# Altium footprint library NXP_60_26022015.PCBLIB: 287 footprints (part 11 of 18)
Each footprint in its own frame and in the unit in brackets; x right, y up, seen from the top. Pads: shape width x height; smd on the part's side, far side on the other; paste and mask are expansions set on the pad; w line width, h text height; cw(c..) or ccw(c..) is an arc to the next point about the centre after c.
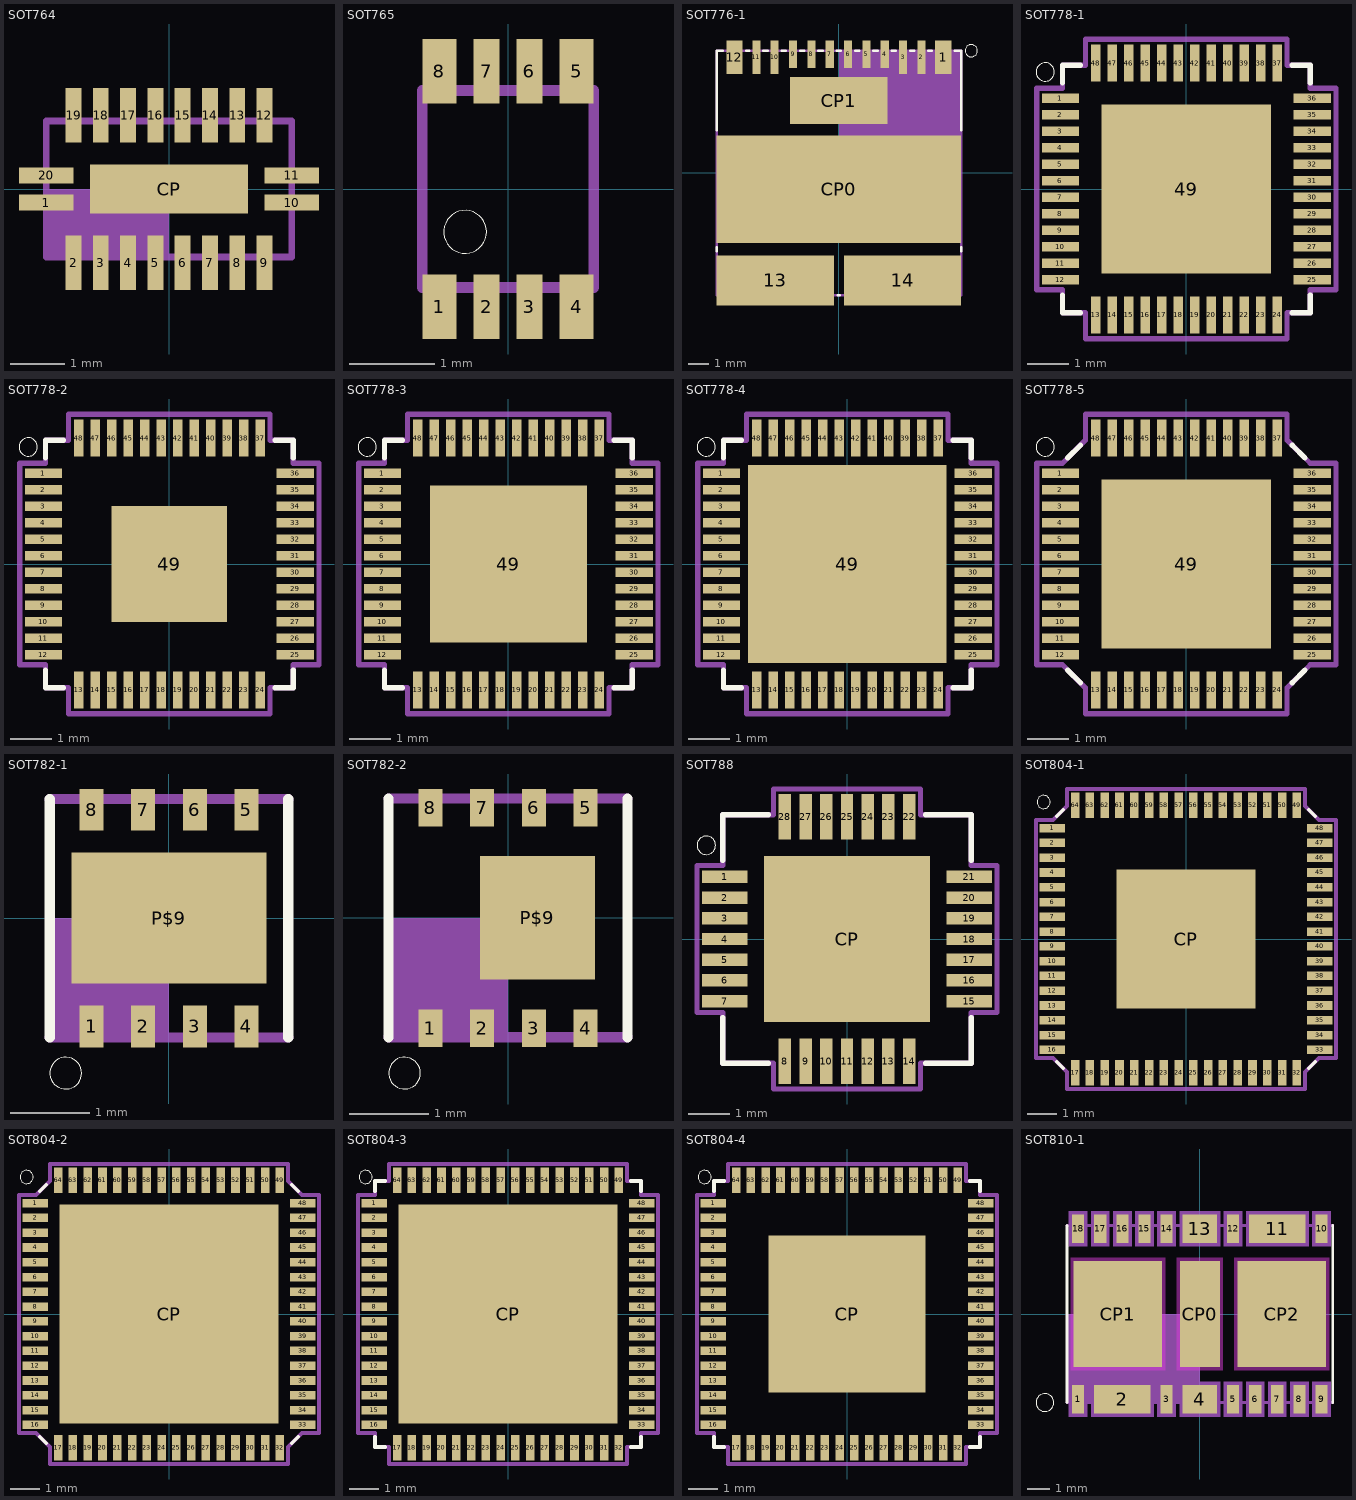
[diagram p10: the footprints below, top view; thin cyan lines are the x and y axes]

## SOT764 [mm]
pads (21):
  rect 1x0.29 smd: 1(-2.25,-0.25) 10(2.25,-0.25) 11(2.25,0.25) 20(-2.25,0.25)
  rect 0.29x1 smd: 2(-1.75,-1.35) 3(-1.25,-1.35) 4(-0.75,-1.35) 5(-0.25,-1.35) 6(0.25,-1.35) 7(0.75,-1.35) 8(1.25,-1.35) 9(1.75,-1.35) 12(1.75,1.35) 13(1.25,1.35) 14(0.75,1.35) 15(0.25,1.35) 16(-0.25,1.35) 17(-0.75,1.35) 18(-1.25,1.35) 19(-1.75,1.35)
  rect 2.9x0.9 smd: CP(0,0)
Top Paste:
  rectangle: -0.85,-0.2 -0.2,0.2
  rectangle: 0.2,-0.2 0.85,0.2
Mechanical 16:
  rectangle: -2.25,-1.25 0,0
  lines w0.127: -2.25,-1.25 2.25,-1.25 2.25,1.25 -2.25,1.25 -2.25,-1.25

## SOT765 [mil]
pads (8):
  rect 15.75x29.53 smd: 1(-31.5,-54.13) 4(31.5,-54.13) 5(31.5,54.13) 8(-31.5,54.13)
  rect 11.81x29.53 smd: 2(-9.84,-54.13) 3(9.84,-54.13) 6(9.84,54.13) 7(-9.84,54.13)
Top Overlay:
  circle w0: c-19.69,-19.69 r9.84
Mechanical 16:
  rectangle: -14.17,45.28 -5.51,61.02
  rectangle: -33.86,45.28 -25.2,61.02
  rectangle: 5.51,45.28 14.17,61.02
  rectangle: 25.2,45.28 33.86,61.02
  rectangle: 25.2,-61.02 33.86,-45.28
  rectangle: 5.51,-61.02 14.17,-45.28
  rectangle: -14.17,-61.02 -5.51,-45.28
  rectangle: -33.86,-61.02 -25.2,-45.28
  lines w5: -39.37,-45.28 -39.37,45.28 39.37,45.28 39.37,-45.28 -39.37,-45.28

## SOT776-1 [mm]
pads (16):
  rect 0.8x1.65 smd: 1(5.125,5.675) 12(-5.125,5.675)
  rect 0.4x1.65 smd: 2(4.05,5.675) 3(3.15,5.675) 10(-3.15,5.675) 11(-4.05,5.675)
  rect 0.4x1.35 smd: 4(2.25,5.825) 5(1.35,5.825) 6(0.45,5.825) 7(-0.45,5.825) 8(-1.35,5.825) 9(-2.25,5.825)
  rect 5.75x2.45 smd: 13(-3.125,-5.275) 14(3.125,-5.275)
  rect 12x5.3 smd: CP0(0,-0.8)
  rect 4.8x2.3 smd: CP1(0,3.55)
Top Overlay:
  circle w0: c6.5,6 r0.3
  lines w0.127: -6,-3.85 -6,-3.65 ; -6,2.1 -6,6 -5.7,6 ; -4.55,6 -4.4,6 ; -3.7,6 -3.5,6 ; -2.8,6 -2.6,6 ; -1.9,6 -1.7,6 ; -1,6 -0.8,6 ; -0.1,6 0.1,6 ; -0.05,-6 0.05,-6 ; 0.8,6 1,6 ; 1.7,6 1.9,6 ; 2.6,6 2.8,6 ; 3.5,6 3.7,6 ; 4.4,6 4.55,6 ; 5.7,6 6,6 6,2.1 ; 6,-3.85 6,-3.65
Top Paste:
  rectangle: 4.775,4.9 5.475,6.45
  rectangle: -5.475,4.9 -4.775,6.45
  rectangle: -0.6,5.2 -0.3,6.45
  rectangle: 0.3,5.2 0.6,6.45
  rectangle: 1.2,5.2 1.5,6.45
  rectangle: -1.5,5.2 -1.2,6.45
  rectangle: -2.4,5.2 -2.1,6.45
  rectangle: 2.1,5.2 2.4,6.45
  rectangle: -3.3,4.9 -3,6.45
  rectangle: -4.2,4.9 -3.9,6.45
  rectangle: 3.9,4.9 4.2,6.45
  rectangle: 3,4.9 3.3,6.45
  rectangle: -0.35,3.1 0.35,4
  rectangle: -1.55,3.1 -0.85,4
  rectangle: 0.85,3.1 1.55,4
  rectangle: -0.9,-1.15 -0.2,-0.45
  rectangle: -2,-1.15 -1.3,-0.45
  rectangle: -3.1,-1.15 -2.4,-0.45
  rectangle: 0.2,-1.15 0.9,-0.45
  rectangle: 1.3,-1.15 2,-0.45
  rectangle: 2.4,-1.15 3.1,-0.45
  rectangle: -3.1,0.1 -2.4,0.8
  rectangle: -2,0.1 -1.3,0.8
  rectangle: -0.9,0.1 -0.2,0.8
  rectangle: 0.2,0.1 0.9,0.8
  rectangle: 1.3,0.1 2,0.8
  rectangle: 2.4,0.1 3.1,0.8
  rectangle: 2.4,-2.4 3.1,-1.7
  rectangle: 1.3,-2.4 2,-1.7
  rectangle: 0.2,-2.4 0.9,-1.7
  rectangle: -0.9,-2.4 -0.2,-1.7
  rectangle: -2,-2.4 -1.3,-1.7
  rectangle: -3.1,-2.4 -2.4,-1.7
  rectangle: -3.25,-5.475 -2.55,-4.575
  rectangle: -4.45,-5.475 -3.75,-4.575
  rectangle: -2.05,-5.475 -1.35,-4.575
  rectangle: 2.55,-5.475 3.25,-4.575
  rectangle: 1.35,-5.475 2.05,-4.575
  rectangle: 3.75,-5.475 4.45,-4.575
Top Solder:
  rectangle: 4.65,4.775 5.6,6.575
  rectangle: -5.6,4.775 -4.65,6.575
  rectangle: -0.725,5.075 -0.175,6.575
  rectangle: 0.175,5.075 0.725,6.575
  rectangle: 1.075,5.075 1.625,6.575
  rectangle: -1.625,5.075 -1.075,6.575
  rectangle: -2.525,5.075 -1.975,6.575
  rectangle: 1.975,5.075 2.525,6.575
  rectangle: -3.425,4.775 -2.875,6.575
  rectangle: -4.325,4.775 -3.775,6.575
  rectangle: 3.775,4.775 4.325,6.575
  rectangle: 2.875,4.775 3.425,6.575
Mechanical 16:
  rectangle: 0,0 6,6
  lines w0.127: -6,-6 6,-6 6,6 -6,6 -6,-6

## SOT778-1 [mm]
pads (49):
  rect 0.9x0.23 smd: 1(-3.05,2.2) 2(-3.05,1.8) 3(-3.05,1.4) 4(-3.05,1) 5(-3.05,0.6) 6(-3.05,0.2) 7(-3.05,-0.2) 8(-3.05,-0.6) 9(-3.05,-1) 10(-3.05,-1.4) 11(-3.05,-1.8) 12(-3.05,-2.2) 25(3.05,-2.2) 26(3.05,-1.8) 27(3.05,-1.4) 28(3.05,-1) 29(3.05,-0.6) 30(3.05,-0.2) 31(3.05,0.2) 32(3.05,0.6) 33(3.05,1) 34(3.05,1.4) 35(3.05,1.8) 36(3.05,2.2)
  rect 0.23x0.9 smd: 13(-2.2,-3.05) 14(-1.8,-3.05) 15(-1.4,-3.05) 16(-1,-3.05) 17(-0.6,-3.05) 18(-0.2,-3.05) 19(0.2,-3.05) 20(0.6,-3.05) 21(1,-3.05) 22(1.4,-3.05) 23(1.8,-3.05) 24(2.2,-3.05) 37(2.2,3.05) 38(1.8,3.05) 39(1.4,3.05) 40(1,3.05) 41(0.6,3.05) 42(0.2,3.05) 43(-0.2,3.05) 44(-0.6,3.05) 45(-1,3.05) 46(-1.4,3.05) 47(-1.8,3.05) 48(-2.2,3.05)
  rect 4.1x4.1 smd: 49(0,0)
Top Overlay:
  circle w0: c-3.418,2.835 r0.224
  lines w0.127: -3,-2.565 -3,-3 -2.565,-3 ; -3,2.565 -3,3 -2.565,3 ; 2.565,-3 3,-3 3,-2.565 ; 2.565,3 3,3 3,2.565
Top Paste:
  rectangle: -0.3,-0.3 0.3,0.3
  rectangle: 0.6,-0.3 1.2,0.3
  rectangle: -1.2,-0.3 -0.6,0.3
  rectangle: -1.2,0.6 -0.6,1.2
  rectangle: -0.3,0.6 0.3,1.2
  rectangle: 0.6,0.6 1.2,1.2
  rectangle: -1.2,-1.2 -0.6,-0.6
  rectangle: -0.3,-1.2 0.3,-0.6
  rectangle: 0.6,-1.2 1.2,-0.6
Mechanical 16:
  lines w0.127: -3.625,-2.44 -3.625,2.44 -3,2.44 -3,3 -2.44,3 -2.44,3.625 2.44,3.625 2.44,3 3,3 3,2.44 3.625,2.44 3.625,-2.44 3,-2.44 3,-3 2.44,-3 2.44,-3.625 -2.44,-3.625 -2.44,-3 -3,-3 -3,-2.44 -3.625,-2.44

## SOT778-2 [mm]
pads (49):
  rect 0.9x0.23 smd: 1(-3.05,2.2) 2(-3.05,1.8) 3(-3.05,1.4) 4(-3.05,1) 5(-3.05,0.6) 6(-3.05,0.2) 7(-3.05,-0.2) 8(-3.05,-0.6) 9(-3.05,-1) 10(-3.05,-1.4) 11(-3.05,-1.8) 12(-3.05,-2.2) 25(3.05,-2.2) 26(3.05,-1.8) 27(3.05,-1.4) 28(3.05,-1) 29(3.05,-0.6) 30(3.05,-0.2) 31(3.05,0.2) 32(3.05,0.6) 33(3.05,1) 34(3.05,1.4) 35(3.05,1.8) 36(3.05,2.2)
  rect 0.23x0.9 smd: 13(-2.2,-3.05) 14(-1.8,-3.05) 15(-1.4,-3.05) 16(-1,-3.05) 17(-0.6,-3.05) 18(-0.2,-3.05) 19(0.2,-3.05) 20(0.6,-3.05) 21(1,-3.05) 22(1.4,-3.05) 23(1.8,-3.05) 24(2.2,-3.05) 37(2.2,3.05) 38(1.8,3.05) 39(1.4,3.05) 40(1,3.05) 41(0.6,3.05) 42(0.2,3.05) 43(-0.2,3.05) 44(-0.6,3.05) 45(-1,3.05) 46(-1.4,3.05) 47(-1.8,3.05) 48(-2.2,3.05)
  rect 2.8x2.8 smd: 49(0,0)
Top Overlay:
  circle w0: c-3.418,2.835 r0.224
  lines w0.127: -3,-2.565 -3,-3 -2.565,-3 ; -3,2.565 -3,3 -2.565,3 ; 2.565,-3 3,-3 3,-2.565 ; 2.565,3 3,3 3,2.565
Top Paste:
  rectangle: 0.2,0.2 0.8,0.8
  rectangle: 0.2,-0.8 0.8,-0.2
  rectangle: -0.8,-0.8 -0.2,-0.2
  rectangle: -0.8,0.2 -0.2,0.8
Mechanical 16:
  lines w0.127: -3.625,-2.44 -3.625,2.44 -3,2.44 -3,3 -2.44,3 -2.44,3.625 2.44,3.625 2.44,3 3,3 3,2.44 3.625,2.44 3.625,-2.44 3,-2.44 3,-3 2.44,-3 2.44,-3.625 -2.44,-3.625 -2.44,-3 -3,-3 -3,-2.44 -3.625,-2.44

## SOT778-3 [mm]
pads (49):
  rect 0.9x0.23 smd: 1(-3.05,2.2) 2(-3.05,1.8) 3(-3.05,1.4) 4(-3.05,1) 5(-3.05,0.6) 6(-3.05,0.2) 7(-3.05,-0.2) 8(-3.05,-0.6) 9(-3.05,-1) 10(-3.05,-1.4) 11(-3.05,-1.8) 12(-3.05,-2.2) 25(3.05,-2.2) 26(3.05,-1.8) 27(3.05,-1.4) 28(3.05,-1) 29(3.05,-0.6) 30(3.05,-0.2) 31(3.05,0.2) 32(3.05,0.6) 33(3.05,1) 34(3.05,1.4) 35(3.05,1.8) 36(3.05,2.2)
  rect 0.23x0.9 smd: 13(-2.2,-3.05) 14(-1.8,-3.05) 15(-1.4,-3.05) 16(-1,-3.05) 17(-0.6,-3.05) 18(-0.2,-3.05) 19(0.2,-3.05) 20(0.6,-3.05) 21(1,-3.05) 22(1.4,-3.05) 23(1.8,-3.05) 24(2.2,-3.05) 37(2.2,3.05) 38(1.8,3.05) 39(1.4,3.05) 40(1,3.05) 41(0.6,3.05) 42(0.2,3.05) 43(-0.2,3.05) 44(-0.6,3.05) 45(-1,3.05) 46(-1.4,3.05) 47(-1.8,3.05) 48(-2.2,3.05)
  rect 3.8x3.8 smd: 49(0,0)
Top Overlay:
  circle w0: c-3.418,2.835 r0.224
  lines w0.127: -3,-2.565 -3,-3 -2.565,-3 ; -3,2.565 -3,3 -2.565,3 ; 2.565,-3 3,-3 3,-2.565 ; 2.565,3 3,3 3,2.565
Top Paste:
  rectangle: -0.3,-0.3 0.3,0.3
  rectangle: 0.6,-0.3 1.2,0.3
  rectangle: -1.2,-0.3 -0.6,0.3
  rectangle: -1.2,0.6 -0.6,1.2
  rectangle: -0.3,0.6 0.3,1.2
  rectangle: 0.6,0.6 1.2,1.2
  rectangle: -1.2,-1.2 -0.6,-0.6
  rectangle: -0.3,-1.2 0.3,-0.6
  rectangle: 0.6,-1.2 1.2,-0.6
Mechanical 16:
  lines w0.127: -3.625,-2.44 -3.625,2.44 -3,2.44 -3,3 -2.44,3 -2.44,3.625 2.44,3.625 2.44,3 3,3 3,2.44 3.625,2.44 3.625,-2.44 3,-2.44 3,-3 2.44,-3 2.44,-3.625 -2.44,-3.625 -2.44,-3 -3,-3 -3,-2.44 -3.625,-2.44

## SOT778-4 [mm]
pads (49):
  rect 0.9x0.23 smd: 1(-3.05,2.2) 2(-3.05,1.8) 3(-3.05,1.4) 4(-3.05,1) 5(-3.05,0.6) 6(-3.05,0.2) 7(-3.05,-0.2) 8(-3.05,-0.6) 9(-3.05,-1) 10(-3.05,-1.4) 11(-3.05,-1.8) 12(-3.05,-2.2) 25(3.05,-2.2) 26(3.05,-1.8) 27(3.05,-1.4) 28(3.05,-1) 29(3.05,-0.6) 30(3.05,-0.2) 31(3.05,0.2) 32(3.05,0.6) 33(3.05,1) 34(3.05,1.4) 35(3.05,1.8) 36(3.05,2.2)
  rect 0.23x0.9 smd: 13(-2.2,-3.05) 14(-1.8,-3.05) 15(-1.4,-3.05) 16(-1,-3.05) 17(-0.6,-3.05) 18(-0.2,-3.05) 19(0.2,-3.05) 20(0.6,-3.05) 21(1,-3.05) 22(1.4,-3.05) 23(1.8,-3.05) 24(2.2,-3.05) 37(2.2,3.05) 38(1.8,3.05) 39(1.4,3.05) 40(1,3.05) 41(0.6,3.05) 42(0.2,3.05) 43(-0.2,3.05) 44(-0.6,3.05) 45(-1,3.05) 46(-1.4,3.05) 47(-1.8,3.05) 48(-2.2,3.05)
  rect 4.8x4.8 smd: 49(0,0)
Top Overlay:
  circle w0: c-3.418,2.835 r0.224
  lines w0.127: -3,-2.565 -3,-3 -2.565,-3 ; -3,2.565 -3,3 -2.565,3 ; 2.565,-3 3,-3 3,-2.565 ; 2.565,3 3,3 3,2.565
Top Paste:
  rectangle: -0.3,-0.3 0.3,0.3
  rectangle: 0.6,-0.3 1.2,0.3
  rectangle: -1.2,-0.3 -0.6,0.3
  rectangle: -1.2,0.6 -0.6,1.2
  rectangle: -0.3,0.6 0.3,1.2
  rectangle: 0.6,0.6 1.2,1.2
  rectangle: -1.2,-1.2 -0.6,-0.6
  rectangle: -0.3,-1.2 0.3,-0.6
  rectangle: 0.6,-1.2 1.2,-0.6
Mechanical 16:
  lines w0.127: -3.625,-2.44 -3.625,2.44 -3,2.44 -3,3 -2.44,3 -2.44,3.625 2.44,3.625 2.44,3 3,3 3,2.44 3.625,2.44 3.625,-2.44 3,-2.44 3,-3 2.44,-3 2.44,-3.625 -2.44,-3.625 -2.44,-3 -3,-3 -3,-2.44 -3.625,-2.44

## SOT778-5 [mm]
pads (49):
  rect 0.9x0.23 smd: 1(-3.05,2.2) 2(-3.05,1.8) 3(-3.05,1.4) 4(-3.05,1) 5(-3.05,0.6) 6(-3.05,0.2) 7(-3.05,-0.2) 8(-3.05,-0.6) 9(-3.05,-1) 10(-3.05,-1.4) 11(-3.05,-1.8) 12(-3.05,-2.2) 25(3.05,-2.2) 26(3.05,-1.8) 27(3.05,-1.4) 28(3.05,-1) 29(3.05,-0.6) 30(3.05,-0.2) 31(3.05,0.2) 32(3.05,0.6) 33(3.05,1) 34(3.05,1.4) 35(3.05,1.8) 36(3.05,2.2)
  rect 0.23x0.9 smd: 13(-2.2,-3.05) 14(-1.8,-3.05) 15(-1.4,-3.05) 16(-1,-3.05) 17(-0.6,-3.05) 18(-0.2,-3.05) 19(0.2,-3.05) 20(0.6,-3.05) 21(1,-3.05) 22(1.4,-3.05) 23(1.8,-3.05) 24(2.2,-3.05) 37(2.2,3.05) 38(1.8,3.05) 39(1.4,3.05) 40(1,3.05) 41(0.6,3.05) 42(0.2,3.05) 43(-0.2,3.05) 44(-0.6,3.05) 45(-1,3.05) 46(-1.4,3.05) 47(-1.8,3.05) 48(-2.2,3.05)
  rect 4.1x4.1 smd: 49(0,0)
Top Overlay:
  circle w0: c-3.418,2.835 r0.224
  lines w0.127: -2.875,-2.565 -2.565,-2.875 ; -2.875,2.565 -2.565,2.875 ; 2.565,-2.875 2.875,-2.565 ; 2.565,2.875 2.875,2.565
Top Paste:
  rectangle: -0.3,-0.3 0.3,0.3
  rectangle: 0.6,-0.3 1.2,0.3
  rectangle: -1.2,-0.3 -0.6,0.3
  rectangle: -1.2,0.6 -0.6,1.2
  rectangle: -0.3,0.6 0.3,1.2
  rectangle: 0.6,0.6 1.2,1.2
  rectangle: -1.2,-1.2 -0.6,-0.6
  rectangle: -0.3,-1.2 0.3,-0.6
  rectangle: 0.6,-1.2 1.2,-0.6
Mechanical 16:
  lines w0.127: -3.625,-2.44 -3.625,2.44 -3,2.44 -2.44,3 -2.44,3.625 2.44,3.625 2.44,3 3,2.44 3.625,2.44 3.625,-2.44 3,-2.44 2.44,-3 2.44,-3.625 -2.44,-3.625 -2.44,-3 -3,-2.44 -3.625,-2.44

## SOT782-1 [mm]
pads (9):
  rect 0.3x0.525 smd: 1(-0.975,-1.362) 2(-0.325,-1.362) 3(0.325,-1.362) 4(0.975,-1.362) 5(0.975,1.362) 6(0.325,1.362) 7(-0.325,1.362) 8(-0.975,1.362)
  rect 2.45x1.65 smd: P$9(0,0)
Top Overlay:
  circle w0: c-1.3,-1.95 r0.2
  lines w0.127: -1.5,-1.5 -1.5,1.5 ; 1.5,-1.5 1.5,1.5
Top Paste:
  rectangle: -0.55,-0.325 0.55,0.325
Mechanical 16:
  rectangle: -1.5,-1.5 0,0
  lines w0.127: -1.5,-1.5 1.5,-1.5 ; -1.5,1.5 1.5,1.5

## SOT782-2 [mil]
pads (9):
  rect 11.81x18.5 smd: 1(-38.39,-54.53) 2(-12.8,-54.53) 3(12.8,-54.53) 4(38.39,-54.53) 5(38.39,54.53) 6(12.8,54.53) 7(-12.8,54.53) 8(-38.39,54.53)
  rect 57.09x61.02 smd: P$9(14.57,0)
Top Overlay:
  circle w0: c-51.18,-76.77 r7.87
  lines w5: -59.06,-59.06 -59.06,59.06 ; 59.06,-59.06 59.06,59.06
Top Paste:
  rectangle: 4.72,-11.81 24.41,11.81
Mechanical 16:
  rectangle: -59.06,-59.06 0,0
  lines w5: -59.06,-59.06 59.06,-59.06 ; -59.06,59.06 59.06,59.06

## SOT788 [mm]
pads (29):
  rect 1.1x0.3 smd: 1(-2.95,1.5) 2(-2.95,1) 3(-2.95,0.5) 4(-2.95,0) 5(-2.95,-0.5) 6(-2.95,-1) 7(-2.95,-1.5) 15(2.95,-1.5) 16(2.95,-1) 17(2.95,-0.5) 18(2.95,0) 19(2.95,0.5) 20(2.95,1) 21(2.95,1.5)
  rect 0.3x1.1 smd: 8(-1.5,-2.95) 9(-1,-2.95) 10(-0.5,-2.95) 11(0,-2.95) 12(0.5,-2.95) 13(1,-2.95) 14(1.5,-2.95) 22(1.5,2.95) 23(1,2.95) 24(0.5,2.95) 25(0,2.95) 26(-0.5,2.95) 27(-1,2.95) 28(-1.5,2.95)
  rect 4x4 smd: CP(0,0)
Top Overlay:
  circle w0: c-3.4,2.265 r0.224
  lines w0.127: -3,-1.9 -3,-3 -1.9,-3 ; -3,1.9 -3,3 -1.9,3 ; 1.9,-3 3,-3 3,-1.9 ; 1.9,3 3,3 3,1.9
Top Paste:
  rectangle: -0.3,-0.3 0.3,0.3
  rectangle: 0.6,-0.3 1.2,0.3
  rectangle: -1.2,-0.3 -0.6,0.3
  rectangle: -1.2,0.6 -0.6,1.2
  rectangle: -0.3,0.6 0.3,1.2
  rectangle: 0.6,0.6 1.2,1.2
  rectangle: -1.2,-1.2 -0.6,-0.6
  rectangle: -0.3,-1.2 0.3,-0.6
  rectangle: 0.6,-1.2 1.2,-0.6
Mechanical 16:
  lines w0.127: -3.625,-1.775 -3.625,1.775 -3,1.775 -3,3 -1.775,3 -1.775,3.625 1.775,3.625 1.775,3 3,3 3,1.775 3.625,1.775 3.625,-1.775 3,-1.775 3,-3 1.775,-3 1.775,-3.625 -1.775,-3.625 -1.775,-3 -3,-3 -3,-1.775 -3.625,-1.775

## SOT804-1 [mm]
pads (65):
  rect 0.85x0.29 smd: 1(-4.525,3.75) 2(-4.525,3.25) 3(-4.525,2.75) 4(-4.525,2.25) 5(-4.525,1.75) 6(-4.525,1.25) 7(-4.525,0.75) 8(-4.525,0.25) 9(-4.525,-0.25) 10(-4.525,-0.75) 11(-4.525,-1.25) 12(-4.525,-1.75) 13(-4.525,-2.25) 14(-4.525,-2.75) 15(-4.525,-3.25) 16(-4.525,-3.75) 33(4.525,-3.75) 34(4.525,-3.25) 35(4.525,-2.75) 36(4.525,-2.25) 37(4.525,-1.75) 38(4.525,-1.25) 39(4.525,-0.75) 40(4.525,-0.25) 41(4.525,0.25) 42(4.525,0.75) 43(4.525,1.25) 44(4.525,1.75) 45(4.525,2.25) 46(4.525,2.75) 47(4.525,3.25) 48(4.525,3.75)
  rect 0.29x0.85 smd: 17(-3.75,-4.525) 18(-3.25,-4.525) 19(-2.75,-4.525) 20(-2.25,-4.525) 21(-1.75,-4.525) 22(-1.25,-4.525) 23(-0.75,-4.525) 24(-0.25,-4.525) 25(0.25,-4.525) 26(0.75,-4.525) 27(1.25,-4.525) 28(1.75,-4.525) 29(2.25,-4.525) 30(2.75,-4.525) 31(3.25,-4.525) 32(3.75,-4.525) 49(3.75,4.525) 50(3.25,4.525) 51(2.75,4.525) 52(2.25,4.525) 53(1.75,4.525) 54(1.25,4.525) 55(0.75,4.525) 56(0.25,4.525) 57(-0.25,4.525) 58(-0.75,4.525) 59(-1.25,4.525) 60(-1.75,4.525) 61(-2.25,4.525) 62(-2.75,4.525) 63(-3.25,4.525) 64(-3.75,4.525)
  rect 4.7x4.7 smd: CP(0,0)
Top Overlay:
  circle w0: c-4.818,4.635 r0.224
  lines w0.127: -4.375,-4.15 -4.15,-4.375 ; -4.375,4.15 -4.15,4.375 ; 4.15,-4.375 4.375,-4.15 ; 4.15,4.375 4.375,4.15
Top Paste:
  rectangle: -0.35,-0.35 0.35,0.35
  rectangle: 0.7,-0.35 1.4,0.35
  rectangle: -1.4,-0.35 -0.7,0.35
  rectangle: -0.35,0.7 0.35,1.4
  rectangle: -1.4,0.7 -0.7,1.4
  rectangle: 0.7,0.7 1.4,1.4
  rectangle: -1.4,-1.4 -0.7,-0.7
  rectangle: -0.35,-1.4 0.35,-0.7
  rectangle: 0.7,-1.4 1.4,-0.7
Mechanical 16:
  lines w0.127: -5.075,-4.025 -5.075,4.025 -4.5,4.025 -4.025,4.5 -4.025,5.075 4.025,5.075 4.025,4.5 4.5,4.025 5.075,4.025 5.075,-4.025 4.5,-4.025 4.025,-4.5 4.025,-5.075 -4.025,-5.075 -4.025,-4.5 -4.5,-4.025 -5.075,-4.025
  text "SOT804-1" at -0.625,-2.875 h0.17

## SOT804-2 [mm]
pads (65):
  rect 0.85x0.29 smd: 1(-4.525,3.75) 2(-4.525,3.25) 3(-4.525,2.75) 4(-4.525,2.25) 5(-4.525,1.75) 6(-4.525,1.25) 7(-4.525,0.75) 8(-4.525,0.25) 9(-4.525,-0.25) 10(-4.525,-0.75) 11(-4.525,-1.25) 12(-4.525,-1.75) 13(-4.525,-2.25) 14(-4.525,-2.75) 15(-4.525,-3.25) 16(-4.525,-3.75) 33(4.525,-3.75) 34(4.525,-3.25) 35(4.525,-2.75) 36(4.525,-2.25) 37(4.525,-1.75) 38(4.525,-1.25) 39(4.525,-0.75) 40(4.525,-0.25) 41(4.525,0.25) 42(4.525,0.75) 43(4.525,1.25) 44(4.525,1.75) 45(4.525,2.25) 46(4.525,2.75) 47(4.525,3.25) 48(4.525,3.75)
  rect 0.29x0.85 smd: 17(-3.75,-4.525) 18(-3.25,-4.525) 19(-2.75,-4.525) 20(-2.25,-4.525) 21(-1.75,-4.525) 22(-1.25,-4.525) 23(-0.75,-4.525) 24(-0.25,-4.525) 25(0.25,-4.525) 26(0.75,-4.525) 27(1.25,-4.525) 28(1.75,-4.525) 29(2.25,-4.525) 30(2.75,-4.525) 31(3.25,-4.525) 32(3.75,-4.525) 49(3.75,4.525) 50(3.25,4.525) 51(2.75,4.525) 52(2.25,4.525) 53(1.75,4.525) 54(1.25,4.525) 55(0.75,4.525) 56(0.25,4.525) 57(-0.25,4.525) 58(-0.75,4.525) 59(-1.25,4.525) 60(-1.75,4.525) 61(-2.25,4.525) 62(-2.75,4.525) 63(-3.25,4.525) 64(-3.75,4.525)
  rect 7.4x7.4 smd: CP(0,0)
Top Overlay:
  circle w0: c-4.818,4.635 r0.224
  lines w0.127: -4.375,-4.15 -4.15,-4.375 ; -4.375,4.15 -4.15,4.375 ; 4.15,-4.375 4.375,-4.15 ; 4.15,4.375 4.375,4.15
Top Paste:
  rectangle: 0.175,0.175 0.875,0.875
  rectangle: 1.225,0.175 1.925,0.875
  rectangle: -0.875,0.175 -0.175,0.875
  rectangle: 0.175,1.225 0.875,1.925
  rectangle: -0.875,1.225 -0.175,1.925
  rectangle: 1.225,1.225 1.925,1.925
  rectangle: -0.875,-0.875 -0.175,-0.175
  rectangle: 0.175,-0.875 0.875,-0.175
  rectangle: 1.225,-0.875 1.925,-0.175
  rectangle: -0.875,-1.925 -0.175,-1.225
  rectangle: 0.175,-1.925 0.875,-1.225
  rectangle: 1.225,-1.925 1.925,-1.225
  rectangle: -1.925,1.225 -1.225,1.925
  rectangle: -1.925,0.175 -1.225,0.875
  rectangle: -1.925,-0.875 -1.225,-0.175
  rectangle: -1.925,-1.925 -1.225,-1.225
Mechanical 16:
  lines w0.127: -5.075,-4.025 -5.075,4.025 -4.5,4.025 -4.025,4.5 -4.025,5.075 4.025,5.075 4.025,4.5 4.5,4.025 5.075,4.025 5.075,-4.025 4.5,-4.025 4.025,-4.5 4.025,-5.075 -4.025,-5.075 -4.025,-4.5 -4.5,-4.025 -5.075,-4.025
  text "SOT804-2" at -0.75,-2.875 h0.17

## SOT804-3 [mm]
pads (65):
  rect 0.85x0.29 smd: 1(-4.525,3.75) 2(-4.525,3.25) 3(-4.525,2.75) 4(-4.525,2.25) 5(-4.525,1.75) 6(-4.525,1.25) 7(-4.525,0.75) 8(-4.525,0.25) 9(-4.525,-0.25) 10(-4.525,-0.75) 11(-4.525,-1.25) 12(-4.525,-1.75) 13(-4.525,-2.25) 14(-4.525,-2.75) 15(-4.525,-3.25) 16(-4.525,-3.75) 33(4.525,-3.75) 34(4.525,-3.25) 35(4.525,-2.75) 36(4.525,-2.25) 37(4.525,-1.75) 38(4.525,-1.25) 39(4.525,-0.75) 40(4.525,-0.25) 41(4.525,0.25) 42(4.525,0.75) 43(4.525,1.25) 44(4.525,1.75) 45(4.525,2.25) 46(4.525,2.75) 47(4.525,3.25) 48(4.525,3.75)
  rect 0.29x0.85 smd: 17(-3.75,-4.525) 18(-3.25,-4.525) 19(-2.75,-4.525) 20(-2.25,-4.525) 21(-1.75,-4.525) 22(-1.25,-4.525) 23(-0.75,-4.525) 24(-0.25,-4.525) 25(0.25,-4.525) 26(0.75,-4.525) 27(1.25,-4.525) 28(1.75,-4.525) 29(2.25,-4.525) 30(2.75,-4.525) 31(3.25,-4.525) 32(3.75,-4.525) 49(3.75,4.525) 50(3.25,4.525) 51(2.75,4.525) 52(2.25,4.525) 53(1.75,4.525) 54(1.25,4.525) 55(0.75,4.525) 56(0.25,4.525) 57(-0.25,4.525) 58(-0.75,4.525) 59(-1.25,4.525) 60(-1.75,4.525) 61(-2.25,4.525) 62(-2.75,4.525) 63(-3.25,4.525) 64(-3.75,4.525)
  rect 7.4x7.4 smd: CP(0,0)
Top Overlay:
  circle w0: c-4.818,4.635 r0.224
  lines w0.127: -4.5,-4.15 -4.5,-4.5 -4.15,-4.5 ; -4.5,4.15 -4.5,4.5 -4.15,4.5 ; 4.15,-4.5 4.5,-4.5 4.5,-4.15 ; 4.15,4.5 4.5,4.5 4.5,4.15
Top Paste:
  rectangle: 0.175,0.175 0.875,0.875
  rectangle: 1.225,0.175 1.925,0.875
  rectangle: -0.875,0.175 -0.175,0.875
  rectangle: 0.175,1.225 0.875,1.925
  rectangle: -0.875,1.225 -0.175,1.925
  rectangle: 1.225,1.225 1.925,1.925
  rectangle: -0.875,-0.875 -0.175,-0.175
  rectangle: 0.175,-0.875 0.875,-0.175
  rectangle: 1.225,-0.875 1.925,-0.175
  rectangle: -0.875,-1.925 -0.175,-1.225
  rectangle: 0.175,-1.925 0.875,-1.225
  rectangle: 1.225,-1.925 1.925,-1.225
  rectangle: -1.925,1.225 -1.225,1.925
  rectangle: -1.925,0.175 -1.225,0.875
  rectangle: -1.925,-0.875 -1.225,-0.175
  rectangle: -1.925,-1.925 -1.225,-1.225
Mechanical 16:
  lines w0.127: -5.075,-4.025 -5.075,4.025 -4.5,4.025 -4.5,4.5 -4.025,4.5 -4.025,5.075 4.025,5.075 4.025,4.5 4.5,4.5 4.5,4.025 5.075,4.025 5.075,-4.025 4.5,-4.025 4.5,-4.5 4.025,-4.5 4.025,-5.075 -4.025,-5.075 -4.025,-4.5 -4.5,-4.5 -4.5,-4.025 -5.075,-4.025
  text "SOT804-3" at -0.875,-2.875 h0.17

## SOT804-4 [mm]
pads (65):
  rect 0.85x0.29 smd: 1(-4.525,3.75) 2(-4.525,3.25) 3(-4.525,2.75) 4(-4.525,2.25) 5(-4.525,1.75) 6(-4.525,1.25) 7(-4.525,0.75) 8(-4.525,0.25) 9(-4.525,-0.25) 10(-4.525,-0.75) 11(-4.525,-1.25) 12(-4.525,-1.75) 13(-4.525,-2.25) 14(-4.525,-2.75) 15(-4.525,-3.25) 16(-4.525,-3.75) 33(4.525,-3.75) 34(4.525,-3.25) 35(4.525,-2.75) 36(4.525,-2.25) 37(4.525,-1.75) 38(4.525,-1.25) 39(4.525,-0.75) 40(4.525,-0.25) 41(4.525,0.25) 42(4.525,0.75) 43(4.525,1.25) 44(4.525,1.75) 45(4.525,2.25) 46(4.525,2.75) 47(4.525,3.25) 48(4.525,3.75)
  rect 0.29x0.85 smd: 17(-3.75,-4.525) 18(-3.25,-4.525) 19(-2.75,-4.525) 20(-2.25,-4.525) 21(-1.75,-4.525) 22(-1.25,-4.525) 23(-0.75,-4.525) 24(-0.25,-4.525) 25(0.25,-4.525) 26(0.75,-4.525) 27(1.25,-4.525) 28(1.75,-4.525) 29(2.25,-4.525) 30(2.75,-4.525) 31(3.25,-4.525) 32(3.75,-4.525) 49(3.75,4.525) 50(3.25,4.525) 51(2.75,4.525) 52(2.25,4.525) 53(1.75,4.525) 54(1.25,4.525) 55(0.75,4.525) 56(0.25,4.525) 57(-0.25,4.525) 58(-0.75,4.525) 59(-1.25,4.525) 60(-1.75,4.525) 61(-2.25,4.525) 62(-2.75,4.525) 63(-3.25,4.525) 64(-3.75,4.525)
  rect 5.3x5.3 smd: CP(0,0)
Top Overlay:
  circle w0: c-4.818,4.635 r0.224
  lines w0.127: -4.5,-4.15 -4.5,-4.5 -4.15,-4.5 ; -4.5,4.15 -4.5,4.5 -4.15,4.5 ; 4.15,-4.5 4.5,-4.5 4.5,-4.15 ; 4.15,4.5 4.5,4.5 4.5,4.15
Top Paste:
  rectangle: -0.35,-0.35 0.35,0.35
  rectangle: 0.7,-0.35 1.4,0.35
  rectangle: -1.4,-0.35 -0.7,0.35
  rectangle: -0.35,0.7 0.35,1.4
  rectangle: -1.4,0.7 -0.7,1.4
  rectangle: 0.7,0.7 1.4,1.4
  rectangle: -1.4,-1.4 -0.7,-0.7
  rectangle: -0.35,-1.4 0.35,-0.7
  rectangle: 0.7,-1.4 1.4,-0.7
Mechanical 16:
  lines w0.127: -5.075,-4.025 -5.075,4.025 -4.5,4.025 -4.5,4.5 -4.025,4.5 -4.025,5.075 4.025,5.075 4.025,4.5 4.5,4.5 4.5,4.025 5.075,4.025 5.075,-4.025 4.5,-4.025 4.5,-4.5 4.025,-4.5 4.025,-5.075 -4.025,-5.075 -4.025,-4.5 -4.5,-4.5 -4.5,-4.025 -5.075,-4.025
  text "SOT804-4" at -0.75,-2.25 h0.17

## SOT810-1 [mm]
pads (21):
  rect 0.55x1.3 smd: 1(-5.5,-3.85) 3(-1.5,-3.85) 5(1.5,-3.85) 6(2.5,-3.85) 7(3.5,-3.85) 8(4.5,-3.85) 9(5.5,-3.85) 10(5.5,3.85) 12(1.5,3.85) 14(-1.5,3.85) 15(-2.5,3.85) 16(-3.5,3.85) 17(-4.5,3.85) 18(-5.5,3.85)
  rect 2.55x1.3 smd: 2(-3.5,-3.85) 11(3.5,3.85)
  rect 1.55x1.3 smd: 4(0,-3.85) 13(0,3.85)
  rect 1.8x4.8 smd: CP0(0,0)
  rect 4x4.8 smd: CP1(-3.7,0) CP2(3.7,0)
Top Layer keep-out:
  rectangle: -5.85,-2.55 -1.55,2.55
  rectangle: 1.55,-2.55 5.85,2.55
  rectangle: -1.05,-2.55 1.05,2.55
Top Overlay:
  circle w0: c-7,-4 r0.4
  lines w0.127: -6,-4 -6,4 ; 6,-4 6,4
Top Paste:
  rectangle: -0.725,3.25 0.725,4.45
  rectangle: -1.725,3.25 -1.275,4.45
  rectangle: -2.725,3.25 -2.275,4.45
  rectangle: -3.725,3.25 -3.275,4.45
  rectangle: -4.725,3.25 -4.275,4.45
  rectangle: -5.725,3.25 -5.275,4.45
  rectangle: 5.275,3.25 5.725,4.45
  rectangle: 2.275,3.25 4.725,4.45
  rectangle: 1.275,3.25 1.725,4.45
  rectangle: -0.725,-4.45 0.725,-3.25
  rectangle: -1.725,-4.45 -1.275,-3.25
  rectangle: 4.275,-4.45 4.725,-3.25
  rectangle: 3.275,-4.45 3.725,-3.25
  rectangle: 2.275,-4.45 2.725,-3.25
  rectangle: -5.725,-4.45 -5.275,-3.25
  rectangle: 5.275,-4.45 5.725,-3.25
  rectangle: -4.725,-4.45 -2.275,-3.25
  rectangle: 1.275,-4.45 1.725,-3.25
  rectangle: -3.5,-0.475 -2.3,0.475
  rectangle: -3.5,0.75 -2.3,1.7
  rectangle: -3.5,-1.7 -2.3,-0.75
  rectangle: -5.1,0.75 -3.9,1.7
  rectangle: -5.1,-0.475 -3.9,0.475
  rectangle: -5.1,-1.7 -3.9,-0.75
  rectangle: 3.9,-0.475 5.1,0.475
  rectangle: 3.9,0.75 5.1,1.7
  rectangle: 3.9,-1.7 5.1,-0.75
  rectangle: 2.3,0.75 3.5,1.7
  rectangle: 2.3,-0.475 3.5,0.475
  rectangle: 2.3,-1.7 3.5,-0.75
  rectangle: -0.525,-0.475 0.525,0.475
  rectangle: -0.525,0.75 0.525,1.7
  rectangle: -0.525,-1.7 0.525,-0.75
Top Solder:
  rectangle: -0.85,3.125 0.85,4.575
  rectangle: -1.85,3.125 -1.15,4.575
  rectangle: -2.85,3.125 -2.15,4.575
  rectangle: -3.85,3.125 -3.15,4.575
  rectangle: -4.85,3.125 -4.15,4.575
  rectangle: -5.85,3.125 -5.15,4.575
  rectangle: 5.15,3.125 5.85,4.575
  rectangle: 2.15,3.125 4.85,4.575
  rectangle: 1.15,3.125 1.85,4.575
  rectangle: -0.85,-4.575 0.85,-3.125
  rectangle: -1.85,-4.575 -1.15,-3.125
  rectangle: 4.15,-4.575 4.85,-3.125
  rectangle: 3.15,-4.575 3.85,-3.125
  rectangle: 2.15,-4.575 2.85,-3.125
  rectangle: -5.85,-4.575 -5.15,-3.125
  rectangle: 5.15,-4.575 5.85,-3.125
  rectangle: -4.85,-4.575 -2.15,-3.125
  rectangle: 1.15,-4.575 1.85,-3.125
  rectangle: -5.775,-2.475 -1.625,2.475
  rectangle: 1.625,-2.475 5.775,2.475
  rectangle: -0.975,-2.475 0.975,2.475
Mechanical 16:
  rectangle: -6,-4 0,0
  lines w0.127: -6,-4 6,-4 ; -6,4 6,4
Mechanical 27:
  rectangle: -0.925,3.05 0.925,4.65
  rectangle: -1.925,3.05 -1.075,4.65
  rectangle: -2.925,3.05 -2.075,4.65
  rectangle: -3.925,3.05 -3.075,4.65
  rectangle: -4.925,3.05 -4.075,4.65
  rectangle: -5.925,3.05 -5.075,4.65
  rectangle: 5.075,3.05 5.925,4.65
  rectangle: 2.075,3.05 4.925,4.65
  rectangle: 1.075,3.05 1.925,4.65
  rectangle: -0.925,-4.65 0.925,-3.05
  rectangle: -1.925,-4.65 -1.075,-3.05
  rectangle: 4.075,-4.65 4.925,-3.05
  rectangle: 3.075,-4.65 3.925,-3.05
  rectangle: 2.075,-4.65 2.925,-3.05
  rectangle: -5.925,-4.65 -5.075,-3.05
  rectangle: 5.075,-4.65 5.925,-3.05
  rectangle: -4.925,-4.65 -2.075,-3.05
  rectangle: 1.075,-4.65 1.925,-3.05